# Altium footprint library std-th.PcbLib: 245 footprints (part 2 of 16)
Each footprint in its own frame and in the unit in brackets; x right, y up, seen from the top. Pads: shape width x height; smd on the part's side, far side on the other; paste and mask are expansions set on the pad; w line width, h text height; cw(c..) or ccw(c..) is an arc to the next point about the centre after c.
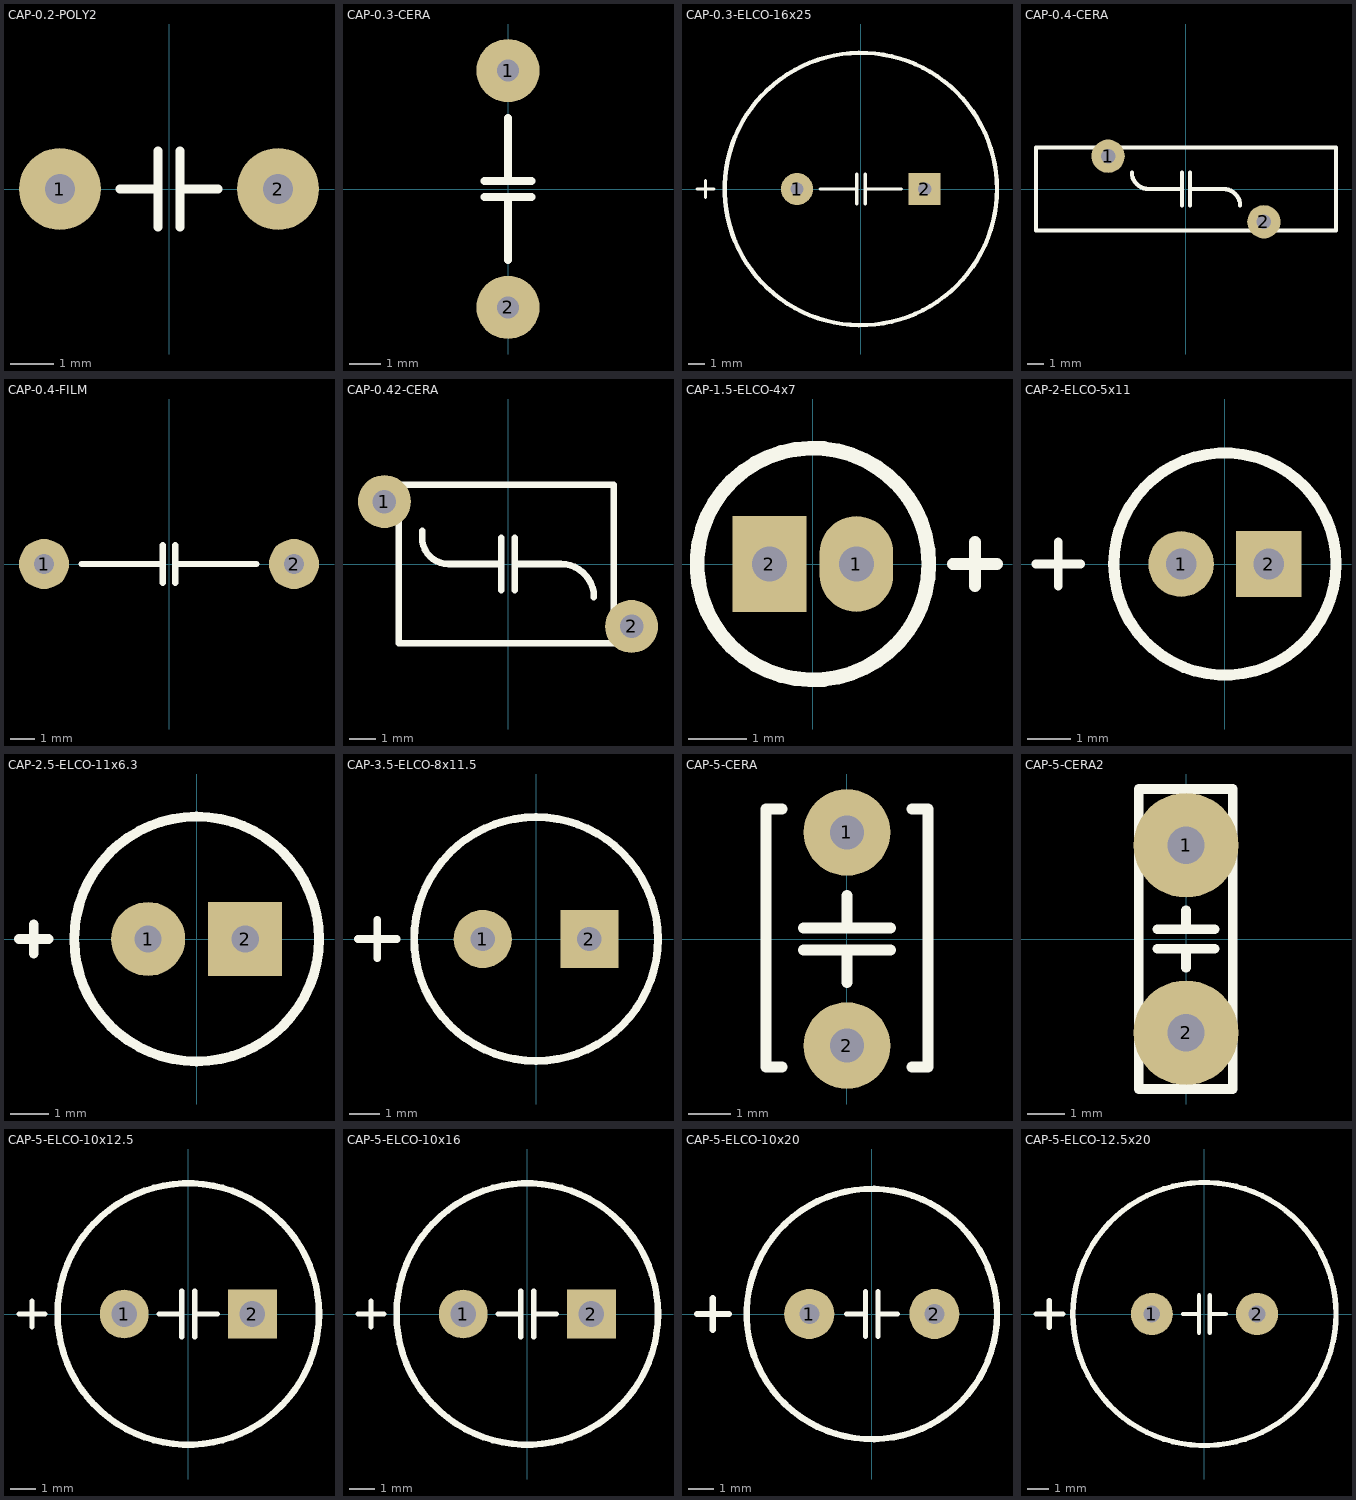
[diagram p1: the footprints below, top view; thin cyan lines are the x and y axes]

## CAP-0.2-POLY2 [mm] "Capacitor, polyester, 200 mil pitch"
height 4.7
pads (2):
  round 1.905 hole 0.7: 1(-2.54,0) 2(2.54,0)
Top Overlay:
  lines w0.203: -1.143,0 -0.254,0 ; -0.254,-0.889 -0.254,0.889 ; 0.254,-0.889 0.254,0.889 ; 0.254,0 1.143,0
3D body: height 7.5, standoff -2.4, extent -3.257,-1.763 3.25,1.737

## CAP-0.3-CERA [mil] "Capacitor, 2 leads, Ceramic, 300 mil pitch, 7 mm disc"
height 275.59
pads (2):
  round 80 hole 27.56: 1(0,150) 2(0,-150)
Top Overlay:
  lines w10: -30,-10 30,-10 ; -30,10 30,10 ; 0,-90 0,-10 ; 0,10 0,90
3D body: height 348.33, standoff -170.82, extent -47.15,-157.5 47.05,157.5

## CAP-0.3-ELCO-16x25 [mm] "Capacitor, Electrolytic, Radial, 16 mm body 7.5mm leads"
height 25
pads (2):
  round 1.905 hole 0.8: 1(-3.81,0)
  rect 1.905x1.905 hole 0.8: 2(3.81,0)
Top Overlay:
  circle w0.254: c0,0 r8.128
  lines w0.203: -9.779,0 -8.763,0 ; -9.271,-0.508 -9.271,0.508 ; -2.413,0 -0.254,0 ; -0.254,-0.889 -0.254,0.889 ; 0.254,-0.889 0.254,0.889 ; 0.254,0 2.413,0
3D body: height 25, standoff -19, extent -8,-8.001 8,7.999

## CAP-0.4-CERA [mil] "Capacitor, Ceramic, 2 leads, 400 mil pitch"
height 500
pads (2):
  round 80 hole 35.43: 1(-187.01,78.74) 2(187.01,-78.74)
Top Overlay:
  lines w10: -130,40 ccw(c-90,40) -90,0 -10,0 ; -10,-40 -10,40 ; 10,-40 10,40 ; 10,0 90,0 cw(c90,-40) 130,-40 ; -360.23,-100 360.25,-100 360.25,100 -360.23,100 -360.23,-100
3D body: height 846.46, standoff -1133.86, extent -360.23,-118.11 360.25,118.11

## CAP-0.4-FILM [mil] "Capacitor, 2 leads, 400 mil pitch"
height 275.59
pads (2):
  round 80 hole 31.5: 1(-200,0) 2(200,0)
Top Overlay:
  lines w10: -140,0 -11.62,0 ; -10,-30 -10,30 ; 10,-30 10,30 ; 11.63,0 140,0
3D body: height 166.09, standoff -141.73, extent -210.03,-63.35 210.05,63.37

## CAP-0.42-CERA [mil] "Capacitor, Ceramic, 2 leads, 420 mil pitch"
height 196.85
pads (2):
  round 80 hole 35.43: 1(-187.01,94.49) 2(187.01,-94.49)
Top Overlay:
  lines w10: -130,50 -130,40 ccw(c-90,40) -90,0 -10,0 ; -10,-40 -10,40 ; 10,-40 10,40 ; 10,0 80,0 cw(c80,-50) 130,-50 ; -165.35,-119.99 -165.35,120.01 160.01,120.01 160.01,74.8 160.01,-119.99 -165.35,-119.99
3D body: height 535.29, standoff -1055.12, extent -210.62,-118.11 210.64,118.11

## CAP-1.5-ELCO-4x7 [mm] "Capacitor, Electrolytic, Radial, 4 mm body 1.5 mm leads"
height 7
pads (2):
  oval 1.27x1.651 hole 0.6: 1(0.75,0)
  rect 1.27x1.651 hole 0.6: 2(-0.75,0)
Top Overlay:
  circle w0.254: c0,0 r2
  lines w0.203: 2.413,0 3.175,0 ; 2.794,-0.381 2.794,0.381
3D body: height 16.56, standoff -7.44, extent -2,-2 2,2

## CAP-2-ELCO-5x11 [mm] "Capacitor, Electrolytic, Radial, 5 mm body 2 mm leads"
height 11
pads (2):
  round 1.5 hole 0.7: 1(-1,0)
  rect 1.5x1.5 hole 0.7: 2(1,0)
Top Overlay:
  circle w0.254: c0,0 r2.54
  lines w0.203: -4.318,0 -3.302,0 ; -3.81,-0.508 -3.81,0.508
3D body: height 11, standoff -19, extent -2.54,-2.5 2.46,2.5

## CAP-2.5-ELCO-11x6.3 [mm] "Capacitor, electrolytic, 11 mm x 6.3 mm, 2.5 mm pitch"
height 11
pads (2):
  round 1.905 hole 0.7: 1(-1.25,0)
  rect 1.905x1.905 hole 0.7: 2(1.25,0)
Top Overlay:
  circle w0.254: c0,0 r3.15
  lines w0.254: -4.572,0 -3.81,0 ; -4.191,-0.381 -4.191,0.381
3D body: height 11, standoff -19, extent -3.175,-3.15 3.125,3.15

## CAP-3.5-ELCO-8x11.5 [mm] "Capacitor, electrolytic, body 8x 11.5 mm; 3.5 mm pitch"
height 11.5
pads (2):
  round 1.905 hole 0.8: 1(-1.75,0)
  rect 1.905x1.905 hole 0.8: 2(1.75,0)
Top Overlay:
  circle w0.254: c0,0 r4
  lines w0.254: -5.842,0 -4.572,0 ; -5.207,-0.635 -5.207,0.635
3D body: height 11.49, standoff -19, extent -4,-4.064 4,3.936

## CAP-5-CERA [mil] "Capacitor, 2 leads, Ceramic, 5 mm pitch, 6 mm disc"
height 314.96
pads (2):
  round 80 hole 31.5: 1(0,98.43) 2(0,-98.43)
Top Overlay:
  lines w10: -60,-118.11 -74.79,-118.11 -74.79,118.11 -74.79,120 -60,120 ; -40,-10 40,-10 ; -40,10 40,10 ; 0,-40 0,-10 ; 0,10 0,40 ; 60,-118.11 74.81,-118.11 74.81,120 60,120
3D body: height 334.65, standoff -988.96, extent -74.79,-118.11 74.81,118.11

## CAP-5-CERA2 [mil] "Capacitor, 2 leads, 5 mm pitch, 8 mm disc"
height 393.7
pads (2):
  round 110 hole 39.37: 1(0,98.43) 2(0,-98.43)
Top Overlay:
  lines w10: -30,-10 30,-10 ; -30,10 30,10 ; 0,-30 0,-10 ; 0,10 0,30 ; -49.6,-157.48 -49.6,157.48 49.22,157.48 49.22,-157.48 -49.6,-157.48
3D body: height 408.09, standoff -86.68, extent -49.6,-157.48 49.22,157.48

## CAP-5-ELCO-10x12.5 [mm] "Capacitor, Electrolytic, Radial, 10 mm body 5 mm leads"
height 13
pads (2):
  round 1.905 hole 1: 1(-2.5,0)
  rect 1.905x1.905 hole 1: 2(2.5,0)
Top Overlay:
  circle w0.254: c0,0 r5.1
  lines w0.203: -6.604,0 -5.588,0 ; -6.096,-0.508 -6.096,0.508 ; -1.143,0 -0.254,0 ; -0.254,-0.889 -0.254,0.889 ; 0.254,-0.889 0.254,0.889 ; 0.254,0 1.143,0
3D body: height 12.12, standoff -19.13, extent -4.88,-4.953 4.88,4.807

## CAP-5-ELCO-10x16 [mm] "Capacitor, Electrolytic, Radial, 10 mm body 5 mm leads"
height 16
pads (2):
  round 1.905 hole 1: 1(-2.5,0)
  rect 1.905x1.905 hole 1: 2(2.5,0)
Top Overlay:
  circle w0.254: c0,0 r5.1
  lines w0.203: -6.604,0 -5.588,0 ; -6.096,-0.508 -6.096,0.508 ; -1.143,0 -0.254,0 ; -0.254,-0.889 -0.254,0.889 ; 0.254,-0.889 0.254,0.889 ; 0.254,0 1.143,0
3D body: height 16, standoff -19, extent -5,-5 5,5

## CAP-5-ELCO-10x20 [mm] "Capacitor, electrolytic, body 10 x 20 mm; 5 mm pitch"
height 20
pads (2):
  round 2 hole 0.8: 1(-2.5,0) 2(2.5,0)
Top Overlay:
  circle w0.254: c0,0 r5
  lines w0.203: -1.016,0 -0.254,0 ; -0.254,-0.889 -0.254,0.889 ; 0.254,-0.889 0.254,0.889 ; 0.254,0 1.016,0
  lines w0.254: -6.985,0 -5.715,0 ; -6.35,-0.635 -6.35,0.635
3D body: height 19.99, standoff -19, extent -5.047,-5 4.953,5

## CAP-5-ELCO-12.5x20 [mm] "Capacitor, electrolytic, body 12.5 x 20 mm; 5 mm pitch"
height 20
pads (2):
  round 2 hole 0.8: 1(-2.5,0) 2(2.5,0)
Top Overlay:
  circle w0.254: c0,0 r6.25
  lines w0.203: -1.016,0 -0.254,0 ; -0.254,-0.889 -0.254,0.889 ; 0.254,-0.889 0.254,0.889 ; 0.254,0 1.016,0
  lines w0.254: -8.001,0 -6.731,0 ; -7.366,-0.635 -7.366,0.635
3D body: height 19.99, standoff -19, extent -6.25,-6.223 6.25,6.277